# Altium integrated library Jesse_Library.IntLib: 1084 symbols (part 1 of 5) (continued)
## Cap 1206 220nF (224) 10% 50V
designator C?, comment 220nF (224) 10% 50V
贴片电容; ComponentLink1Description: 供应商链接; ComponentLink1URL: http://www.szlcsc.com/product/details_2209.html; Package: 1206; Supplier: LC; SuppliersPartNumber: C1857
footprint 1206_C
pins: 1, 2

## Cap 1206 220pF (221) 10% 50V
designator C?, comment 220pF (221) 10% 50V
贴片电容; ComponentLink1Description: 供应商链接; ComponentLink1URL: http://www.szlcsc.com/product/details_2206.html; Package: 1206; Supplier: LC; SuppliersPartNumber: C1854
footprint 1206_C
pins: 1, 2

## Cap 1206 470nF (474) 10% 50V
designator C?, comment 470nF (474) 10% 50V
贴片电容; ComponentLink1Description: 供应商链接; ComponentLink1URL: http://www.szlcsc.com/product/details_2223.html; Package: 1206; Supplier: LC; SuppliersPartNumber: C1871
footprint 1206_C
pins: 1, 2

## Cap 1206 470pF (471) 10% 50V
designator C?, comment 470pF (471) 10% 50V
贴片电容; ComponentLink1Description: 供应商链接; ComponentLink1URL: http://www.szlcsc.com/product/details_2220.html; Package: 1206; Supplier: LC; SuppliersPartNumber: C1868
footprint 1206_C
pins: 1, 2

## Cap 3216 10uF (106) 10% 16V
designator C?, comment 10uF (106) ±10% 16V
钽电容; ComponentLink1Description: 供应商链接; ComponentLink1URL: http://www.szlcsc.com/product/details_7643.html; Package: 3216; Supplier: LC; SuppliersPartNumber: C7171
footprint CAP TAN A3216
pins: 1, 2

## Cap 3216 47uF (476) 20% 10V
designator C?, comment 47uF (476) ±20% 10V
钽电容; Package: 3216; Supplier: LC; SuppliersPartNumber: C7171; ComponentLink1Description: 立创商城链接; ComponentLink1URL: https://item.szlcsc.com/142466.html
footprint CAP TAN A3216
pins: 1, 2

## Cap 3528 100uF (107) 10% 10V
designator C?, comment 100uF (107) ±10% 10V
钽电容; Package: 3528; Supplier: LC; SuppliersPartNumber: C16133; ComponentLink1Description: 立创商城链接; ComponentLink1URL: https://item.szlcsc.com/123913.html
footprint CAP TAN B3528
pins: 1, 2

## Cap INT 6.3X12.0 220uF 20% 25V
designator C?, comment 220uF 20% 25V
直插电解电容; ComponentLink1Description: 立创商城链接; ComponentLink1URL: https://item.szlcsc.com/125495.html
footprint CAP STR 6.3x12 (6.5mm(Dia.) x 12mm(Length) 2.5mm(Lead Spacing))
pins: 1, 2

## Cap SMD 5.0X5.0 47uF 20% 16V
designator C?, comment 47uF 20%  16V
贴片电解电容; ComponentLink1Description: 立创商城链接; ComponentLink1URL: https://item.szlcsc.com/323605.html
footprint CAP SMT 5X5
pins: 1, 2

## Cap SMD 6.3X5.8 100uF 20% 25V
designator C?, comment 100uF 20% 25V
贴片电解电容; ComponentLink1Description: 立创商城链接; ComponentLink1URL: https://item.szlcsc.com/189933.html
footprint CAP SMT 6.6X5.4 (Capacitor, Aluminium Electrolytric, 6.6mm L X 6.6mm W X 5.4mm H, IPC Medium Density)
pins: 1, 2

## Cap SMD 6.3X7.7 68uF 20% 35V
designator C?, comment 68uF 20%  35V
贴片电解电容; ComponentLink1Description: 立创商城链接; ComponentLink1URL: https://item.szlcsc.com/240983.html
footprint CAP SMT6.3X7.7
pins: 1, 2

## Cap SMD 8X10.2 100uF 20% 35V
designator C?, comment 100uF 20% 35V
贴片电解电容; ComponentLink1Description: 立创商城链接; ComponentLink1URL: https://item.szlcsc.com/265672.html
footprint CAP SMT 8X10.5
pins: 1, 2

## Cap SMD 8X10.2 220uF 20% 25V
designator C?, comment 220uF 20% 25V
贴片电解电容; ComponentLink1Description: 立创商城链接; ComponentLink1URL: https://item.szlcsc.com/189896.html
footprint CAP SMT 8X10.5
pins: 1, 2


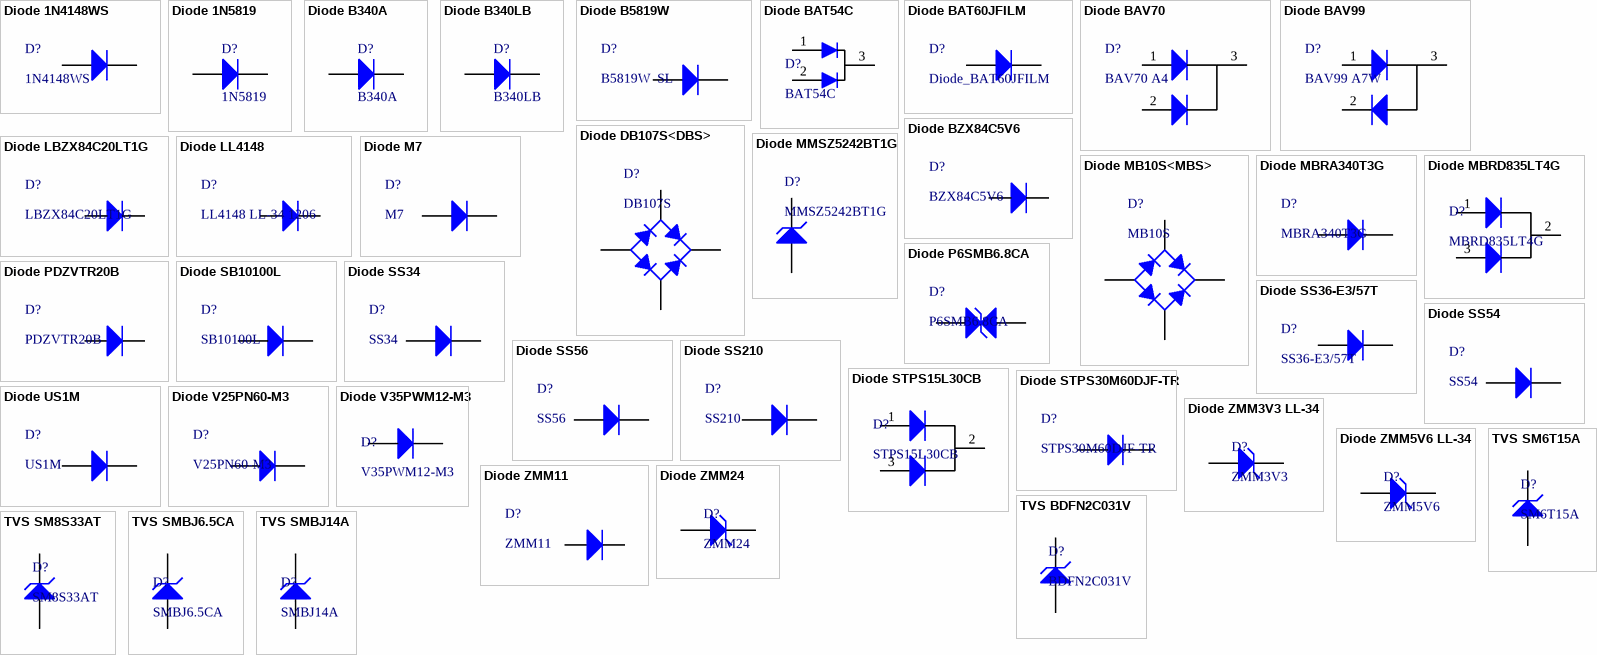
[diagram p11: symbols Diode 1N4148WS to TVS SMBJ14A]

## Diode 1N4148WS
designator D?, comment 1N4148WS
二极管; ComponentLink1Description: 供应商链接; ComponentLink1URL: http://www.szlcsc.com/product/details_2485.html; Package: SOD-323; Supplier: LC; SuppliersPartNumber: C2128
footprint SOD323
pins: 1 A, 2 K

## Diode 1N5819
designator D?, comment 1N5819
肖特基二极管; Published: 8-Jun-2000; LatestRevisionDate: 17-Jul-2002; LatestRevisionNote: Re-released for DXP Platform.; PackageVersion: Sep-1996; PackageReference: SMC; Publisher: Altium Limited; PackageDescription: DO-214-AB/SMC; 2 C-Bend Leads; Body 7.9 x 5.9 mm, inc. leads (LxW); Code_JEDEC: DO-214-AB
footprint SOD123F
pins: 1 A, 2 K

## Diode B340A
designator D?, comment B340A
肖特基二极管; Published: 8-Jun-2000; LatestRevisionDate: 17-Jul-2002; LatestRevisionNote: Re-released for DXP Platform.; PackageVersion: Sep-1996; PackageReference: SMC; Publisher: Altium Limited; PackageDescription: DO-214-AB/SMC; 2 C-Bend Leads; Body 7.9 x 5.9 mm, inc. leads (LxW); Code_JEDEC: DO-214-AB
footprint DO-214AC
pins: 1 A, 2 K

## Diode B340LB
designator D?, comment B340LB
肖特基二极管; Published: 8-Jun-2000; LatestRevisionDate: 17-Jul-2002; LatestRevisionNote: Re-released for DXP Platform.; PackageVersion: Sep-1996; PackageReference: SMC; Publisher: Altium Limited; PackageDescription: DO-214-AB/SMC; 2 C-Bend Leads; Body 7.9 x 5.9 mm, inc. leads (LxW); Code_JEDEC: DO-214-AB
footprint DO-214AA
pins: 1 A, 2 K

## Diode B5819W
designator D?, comment B5819W  SL
肖特基二极管; ComponentLink1Description: 供应商链接; ComponentLink1URL: http://www.szlcsc.com/product/details_9093.html; Package: SOD-123; Supplier: LC; SuppliersPartNumber: C8598
footprint SOD123
pins: 1 A, 2 K

## Diode BAT54C
designator D?, comment BAT54C
肖特基二极管
footprint SOT23-3
pins: 1 A, 2 A, 3 K

## Diode BAT60JFILM
designator D?, comment Diode_BAT60JFILM
二极管; ComponentLink1Description: 供应商链接; ComponentLink1URL: http://www.szlcsc.com/product/details_2485.html; Package: SOD-323; Supplier: LC; SuppliersPartNumber: C2128
footprint SOD323
pins: 1 A, 2 K

## Diode BAV70
designator D?, comment BAV70 A4
开关二极管; ComponentLink1Description: 供应商链接; ComponentLink1URL: http://www.szlcsc.com/product/details_70091.html; Package: SOT-23; Supplier: LC; SuppliersPartNumber: C68978
footprint SOT23-3
pins: 1 A, 2 A, 3 K

## Diode BAV99
designator D?, comment BAV99 A7W
开关二极管; ComponentLink1Description: 供应商链接; ComponentLink1URL: http://www.szlcsc.com/product/details_2877.html; Package: SOT-23; Supplier: LC; SuppliersPartNumber: C2500
footprint SOT23-3
pins: 1 A, 2 A, 3 K

## Diode BZX84C5V6
designator D?, comment BZX84C5V6
开关二极管; ComponentLink1Description: 供应商链接; ComponentLink1URL: http://www.szlcsc.com/product/details_10338.html; Package: LL-34; Supplier: LC; SuppliersPartNumber: C9808
footprint SOT23-3
pins: 1 A, 2 A, 3 K

## Diode DB107S<DBS>
designator D?, comment DB107S
整流桥; ComponentLink1Description: 供应商链接; ComponentLink1URL: http://www.szlcsc.com/product/details_5809.html; Package: DBS; Supplier: LC; SuppliersPartNumber: C5377
footprint DBS
pins: 1 C, 2 K, 3 C, 4 A

## Diode LBZX84C20LT1G
designator D?, comment LBZX84C20LT1G
开关二极管; ComponentLink1Description: 供应商链接; ComponentLink1URL: http://www.szlcsc.com/product/details_10338.html; Package: LL-34; Supplier: LC; SuppliersPartNumber: C9808
footprint SOT23-3
pins: 1 A, 2 A, 3 K

## Diode LL4148
designator D?, comment LL4148 LL-34 1206
开关二极管; ComponentLink1Description: 供应商链接; ComponentLink1URL: http://www.szlcsc.com/product/details_10338.html; Package: LL-34; Supplier: LC; SuppliersPartNumber: C9808
footprint LL-34
pins: 1 A, 2 K

## Diode M7
designator D?, comment M7
二极管; 备注: 1N4007 4007 编号C2464 已经停售, 使用新物料编号C95872; ComponentLink1Description: 供应商链接; ComponentLink1URL: http://www.szlcsc.com/product/details_2841.html; Package: SMA(DO-214AC); Supplier: LC; SuppliersPartNumber: C95872
footprint DO-214AC
pins: 1 A, 2 K

## Diode MB10S<MBS>
designator D?, comment MB10S
整流桥; ComponentLink1Description: 供应商链接; ComponentLink1URL: http://www.szlcsc.com/product/details_2865.html; Package: MBS; Supplier: LC; SuppliersPartNumber: C2488
footprint MBS
pins: 1 C, 2 K, 3 C, 4 A

## Diode MBRA340T3G
designator D?, comment MBRA340T3G
二极管; ComponentLink1Description: 供应商链接; ComponentLink1URL: http://www.szlcsc.com/product/details_23178.html; Package: SMA(DO-214AC); Supplier: LC; SuppliersPartNumber: C22452
footprint DO-214AC
pins: 1 A, 2 K

## Diode MBRD835LT4G
designator D?, comment MBRD835LT4G
肖特基二极管
footprint TO252 (252晶体管)
pins: 1, 2, 3

## Diode MMSZ5242BT1G
designator D?, comment MMSZ5242BT1G
稳压二极管; ComponentLink1Description: 供应商链接; ComponentLink1URL: http://www.szlcsc.com/product/details_10338.html; Package: LL-34; Supplier: LC; SuppliersPartNumber: C9808
footprint SOD123
pins: 1 A, 2 K

## Diode P6SMB6.8CA
designator D?, comment P6SMB6.8CA
TVS管; ComponentLink1Description: 供应商链接; ComponentLink1URL: http://www.szlcsc.com/product/details_79530.html; Package: SMB/DO-214AA; Supplier: LC; SuppliersPartNumber: C78395
footprint DO-214AA
pins: 1 A, 2 K

## Diode PDZVTR20B
designator D?, comment PDZVTR20B
稳压二极管; ComponentLink1Description: 供应商链接; ComponentLink1URL: http://www.szlcsc.com/product/details_10338.html; Package: LL-34; Supplier: LC; SuppliersPartNumber: C9808
footprint SOD128
pins: 1 A, 2 K

## Diode SB10100L
designator D?, comment SB10100L
二极管; ComponentLink1Description: 供应商链接; ComponentLink1URL: http://www.szlcsc.com/product/details_23178.html; Package: SMA(DO-214AC); Supplier: LC; SuppliersPartNumber: C22452
footprint TO277
pins: 1 A, 2 A, K

## Diode SS34
designator D?, comment SS34
二极管; ComponentLink1Description: 供应商链接; ComponentLink1URL: http://www.szlcsc.com/product/details_23178.html; Package: SMA(DO-214AC); Supplier: LC; SuppliersPartNumber: C22452
footprint DO-214AC
pins: 1 A, 2 K

## Diode SS36-E3/57T
designator D?, comment SS36-E3/57T
二极管; ComponentLink1Description: 供应商链接; ComponentLink1URL: http://www.szlcsc.com/product/details_36698.html; Package: SMC(DO-214AB); Supplier: LC; SuppliersPartNumber: C35722
footprint DO-214AB
pins: 1 A, 2 K

## Diode SS54
designator D?, comment SS54
二极管; ComponentLink1Description: 供应商链接; ComponentLink1URL: http://www.szlcsc.com/product/details_23178.html; Package: SMA(DO-214AC); Supplier: LC; SuppliersPartNumber: C22452
footprint DO-214AC
pins: 1 A, 2 K

## Diode SS56
designator D?, comment SS56
二极管; ComponentLink1Description: 供应商链接; ComponentLink1URL: http://www.szlcsc.com/product/details_23178.html; Package: SMA(DO-214AC); Supplier: LC; SuppliersPartNumber: C22452
footprint DO-214AC
pins: 1 A, 2 K

## Diode SS210
designator D?, comment SS210
二极管; ComponentLink1Description: 供应商链接; ComponentLink1URL: http://www.szlcsc.com/product/details_15669.html; Package: SMA(DO-214AC); Supplier: LC; SuppliersPartNumber: C14996
footprint DO-214AC
pins: 1 A, 2 K

## Diode STPS15L30CB
designator D?, comment STPS15L30CB
肖特基二极管
footprint TO252 (252晶体管)
pins: 1, 2, 3

## Diode STPS30M60DJF-TR
designator D?, comment STPS30M60DJF-TR
二极管; ComponentLink1Description: 供应商链接; ComponentLink1URL: http://www.szlcsc.com/product/details_23178.html; Package: SMA(DO-214AC); Supplier: LC; SuppliersPartNumber: C22452
footprint POWERFLAT 5X6
pins: 1 A, 2 A, 3 A, 4 A, 5 K, 6 K, 7 K, 8 K

## Diode US1M
designator D?, comment US1M
二极管; ComponentLink1Description: 供应商链接; ComponentLink1URL: http://www.szlcsc.com/product/details_5885.html; Package: SMA(DO-214AC); Supplier: LC; SuppliersPartNumber: C5441
footprint DO-214AC
pins: 1 A, 2 K

## Diode V25PN60-M3
designator D?, comment V25PN60-M3
肖特基二极管; Package: SMA(DO-214AC); Supplier: LC; SuppliersPartNumber: C22452; ComponentLink1Description: 立创商城链接; ComponentLink1URL: https://item.szlcsc.com/240762.html
footprint TO277
pins: 1 A, 2 A, K

## Diode V35PWM12-M3
designator D?, comment V35PWM12-M3
肖特基二极管; ComponentLink1Description: 立创商城链接; ComponentLink1URL: https://item.szlcsc.com/156647.html
footprint TO252 (252晶体管)
pins: 1, 2, 3

## Diode ZMM3V3 LL-34
designator D?, comment ZMM3V3
稳压二极管; ComponentLink1Description: 供应商链接; ComponentLink1URL: http://www.szlcsc.com/product/details_8535.html; Package: LL-34; Supplier: LC; SuppliersPartNumber: C8056
footprint LL-34
pins: 1 A, 2 K

## Diode ZMM5V6 LL-34
designator D?, comment ZMM5V6
稳压二极管; ComponentLink1Description: 供应商链接; ComponentLink1URL: http://www.szlcsc.com/product/details_8541.html; Package: LL-34; Supplier: LC; SuppliersPartNumber: C8062
footprint LL-34
pins: 1 A, 2 K

## Diode ZMM11
designator D?, comment ZMM11
稳压二极管; ComponentLink1Description: 供应商链接; ComponentLink1URL: http://www.szlcsc.com/product/details_10338.html; Package: LL-34; Supplier: LC; SuppliersPartNumber: C9808
footprint LL-34
pins: 1 A, 2 K

## Diode ZMM24
designator D?, comment ZMM24
稳压二极管; Package: LL-34; Supplier: LC; SuppliersPartNumber: C8062; ComponentLink1Description: 立创商城链接; ComponentLink1URL: https://item.szlcsc.com/8553.html
footprint LL-34
pins: 1 A, 2 K

## TVS BDFN2C031V
designator D?, comment BDFN2C031V
TVS管
footprint DFN2
pins: 1 A, 2 K

## TVS SM6T15A
designator D?, comment SM6T15A
TVS管
footprint DO-214
pins: 1 A, 2 K

## TVS SM8S33AT
designator D?, comment SM8S33AT
TVS管
footprint DO-218 (=DO-218AB)
pins: 1 A, 2 K

## TVS SMBJ6.5CA
designator D?, comment SMBJ6.5CA
TVS管; ComponentLink1Description: 供应商链接; ComponentLink1URL: http://www.szlcsc.com/product/details_23178.html; Package: SMA(DO-214AC); Supplier: LC; SuppliersPartNumber: C22452
footprint DO-214AA
pins: 1 A, 2 K

## TVS SMBJ14A
designator D?, comment SMBJ14A
TVS管; ComponentLink1Description: 供应商链接; ComponentLink1URL: http://www.szlcsc.com/product/details_23178.html; Package: SMA(DO-214AC); Supplier: LC; SuppliersPartNumber: C22452
footprint DO-214AA
pins: 1 A, 2 K

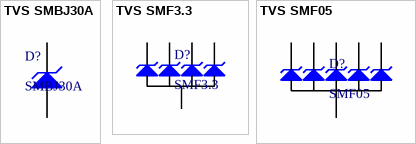
[diagram p12: symbols TVS SMBJ30A to TVS SMF05]

## TVS SMBJ30A
designator D?, comment SMBJ30A
TVS管; ComponentLink1Description: 供应商链接; ComponentLink1URL: http://www.szlcsc.com/product/details_23178.html; Package: SMA(DO-214AC); Supplier: LC; SuppliersPartNumber: C22452
footprint DO-214AA
pins: 1 A, 2 K

## TVS SMF3.3
designator D?, comment SMF3.3
TVS管
footprint SC-70-5
pins: 1, 2, 3, 4, 5

## TVS SMF05
designator D?, comment SMF05
TVS管
footprint SC-70-6(SOT-363)
pins: 1, 2, 3, 4, 5, 6


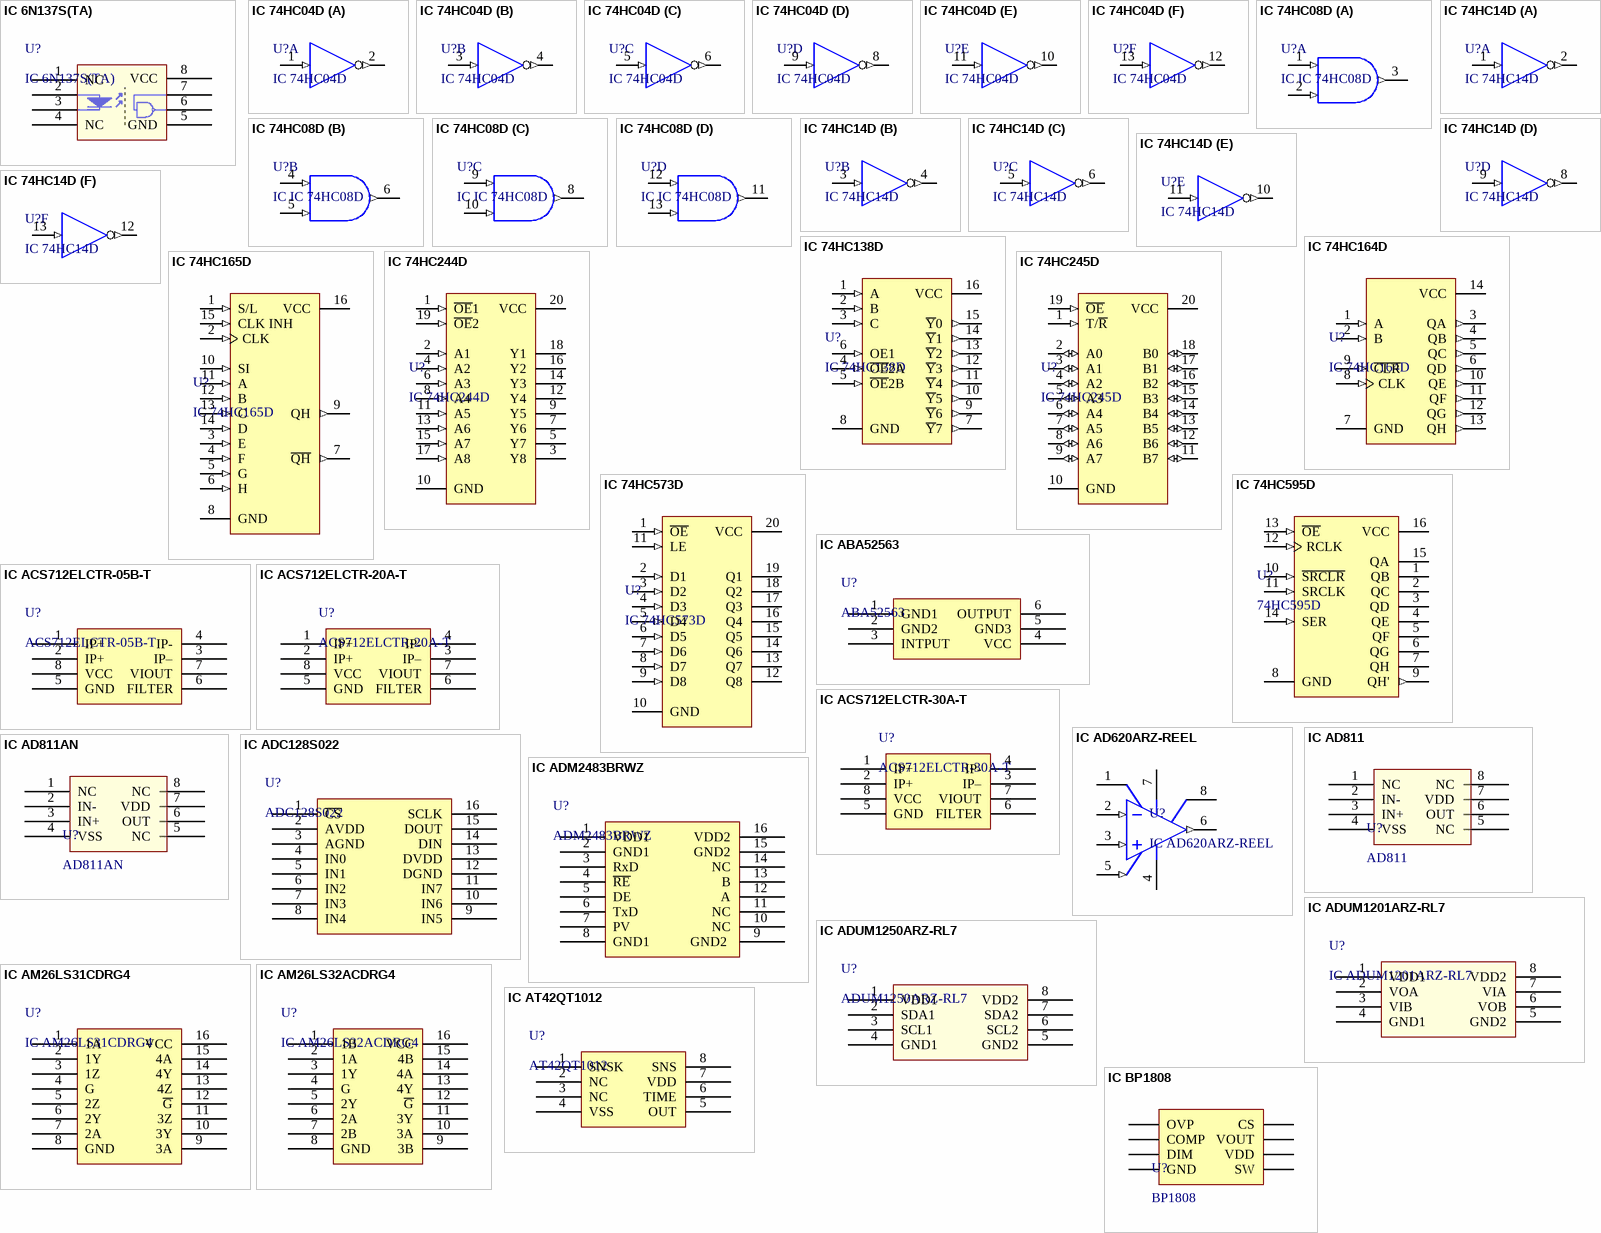
[diagram p13: symbols IC 6N137S(TA) to IC BP1808]

## IC 6N137S(TA)
designator U?
贴片光耦; ComponentLink1Description: 供应商链接; ComponentLink1URL: http://www.szlcsc.com/product/details_17178.html; Package: SMD-8_6.3mm; Supplier: LC; SuppliersPartNumber: C16496
footprint SMD-8_6.3mm
pins: 1 NC, 2 A "Anode", 3 K "Cathode", 4 NC, 5 GND, 6 VO, 7 VE, 8 VCC

## IC 74HC04D
designator U?
74系列逻辑芯片; ComponentLink1Description: 供应商链接; ComponentLink1URL: http://www.szlcsc.com/product/details_6041.html; Package: SOIC-14_150mil; Supplier: LC; SuppliersPartNumber: C5590
footprint SOIC14_150mil
pins on every part: 7 GND (power) hidden, 14 VDD (power) hidden
part A pins: 1 A (in), 2 Y (out)
part B pins: 3 A (in), 4 Y (out)
part C pins: 5 A (in), 6 Y (out)
part D pins: 8 Y (out), 9 A (in)
part E pins: 10 Y (out), 11 A (in)
part F pins: 12 Y (out), 13 A (in)

## IC 74HC08D
designator U?, comment IC IC 74HC08D
74系列逻辑芯片; ComponentLink1Description: 供应商链接; ComponentLink1URL: http://www.szlcsc.com/product/details_6044.html; Package: SOIC-14_150mil; Supplier: LC; SuppliersPartNumber: C5593
footprint SOIC14_150mil
pins on every part: 7 GND (power) hidden, 14 VDD (power) hidden
part A pins: 1 A (in), 2 B (in), 3 Y (out)
part B pins: 4 A (in), 5 B (in), 6 Y (out)
part C pins: 8 Y (out), 9 A (in), 10 B (in)
part D pins: 11 Y (out), 12 A (in), 13 B (in)

## IC 74HC14D
designator U?
74系列逻辑芯片; ComponentLink1Description: 供应商链接; ComponentLink1URL: http://www.szlcsc.com/product/details_6056.html; Package: SOIC-14_150mil; Supplier: LC; SuppliersPartNumber: C5605
footprint SOIC14_150mil
pins on every part: 7 GND (power) hidden, 14 VDD (power) hidden
part A pins: 1 A (in), 2 Y (out)
part B pins: 3 A (in), 4 Y (out)
part C pins: 5 A (in), 6 Y (out)
part D pins: 8 Y (out), 9 A (in)
part E pins: 10 Y (out), 11 A (in)
part F pins: 12 Y (out), 13 A (in)

## IC 74HC138D
designator U?
74系列逻辑芯片; ComponentLink1Description: 供应商链接; ComponentLink1URL: http://www.szlcsc.com/product/details_6053.html; Package: SOIC-16_150mil; Supplier: LC; SuppliersPartNumber: C5602
footprint SOIC16_150mil
pins: 1 A (in), 2 B (in), 3 C (in), 4 ~{OE}2A (in), 5 ~{OE}2B (in), 6 OE1 (in), 7 ~{Y}7 (out), 8 GND (power), 9 ~{Y}6 (out), 10 ~{Y}5 (out), 11 ~{Y}4 (out), 12 ~{Y}3 (out), 13 ~{Y}2 (out), 14 ~{Y}1 (out), 15 ~{Y}0 (out), 16 VCC (power)

## IC 74HC164D
designator U?
74系列逻辑芯片; ComponentLink1Description: 供应商链接; ComponentLink1URL: http://www.szlcsc.com/product/details_7297.html; Package: SOIC-14_150mil; Supplier: LC; SuppliersPartNumber: C6825
footprint SOIC14_150mil
pins: 1 A (in), 2 B (in), 3 QA (out), 4 QB (out), 5 QC (out), 6 QD (out), 7 GND (power), 8 CLK (in), 9 ~{CLR} (in), 10 QE (out), 11 QF (out), 12 QG (out), 13 QH (out), 14 VCC (power)

## IC 74HC165D
designator U?
74系列逻辑芯片; ComponentLink1Description: 供应商链接; ComponentLink1URL: http://www.szlcsc.com/product/details_6064.html; Package: SOIC-16_150mil; Supplier: LC; SuppliersPartNumber: C5613
footprint SOIC16_150mil
pins: 1 S/L (in), 2 CLK (in), 3 E (in), 4 F (in), 5 G (in), 6 H (in), 7 ~{QH} (out), 8 GND (power), 9 QH (out), 10 SI (in), 11 A (in), 12 B (in), 13 C (in), 14 D (in), 15 CLK INH (in), 16 VCC (power)

## IC 74HC244D
designator U?
74系列逻辑芯片; ComponentLink1Description: 供应商链接; ComponentLink1URL: http://www.szlcsc.com/product/details_6073.html; Package: SOIC-20_300mil; Supplier: LC; SuppliersPartNumber: C5622
footprint SOIC20_300mil
pins: 1 ~{OE}1 (in), 2 A1 (in), 3 Y8 (hiz), 4 A2 (in), 5 Y7 (hiz), 6 A3 (in), 7 Y6 (hiz), 8 A4 (in), 9 Y5 (hiz), 10 GND (power), 11 A5 (in), 12 Y4 (hiz), 13 A6 (in), 14 Y3 (hiz), 15 A7 (in), 16 Y2 (hiz), 17 A8 (in), 18 Y1 (hiz), 19 ~{OE}2 (in), 20 VCC (power)

## IC 74HC245D
designator U?
74系列逻辑芯片; ComponentLink1Description: 供应商链接; ComponentLink1URL: http://www.szlcsc.com/product/details_6076.html; Package: SOIC-20_300mil; Supplier: LC; SuppliersPartNumber: C5625
footprint SOIC20_300mil
pins: 1 T/~{R} (in), 2 A0 (io), 3 A1 (io), 4 A2 (io), 5 A3 (io), 6 A4 (io), 7 A5 (io), 8 A6 (io), 9 A7 (io), 10 GND (power), 11 B7 (io), 12 B6 (io), 13 B5 (io), 14 B4 (io), 15 B3 (io), 16 B2 (io), 17 B1 (io), 18 B0 (io), 19 ~{OE} (in), 20 VCC (power)

## IC 74HC573D
designator U?
74系列逻辑芯片; ComponentLink1Description: 供应商链接; ComponentLink1URL: http://www.szlcsc.com/product/details_6059.html; Package: SOIC-20_300mil; Supplier: LC; SuppliersPartNumber: C5608
footprint SOIC20_300mil
pins: 1 ~{OE} (in), 2 D1 (in), 3 D2 (in), 4 D3 (in), 5 D4 (in), 6 D5 (in), 7 D6 (in), 8 D7 (in), 9 D8 (in), 10 GND (power), 11 LE (in), 12 Q8 (hiz), 13 Q7 (hiz), 14 Q6 (hiz), 15 Q5 (hiz), 16 Q4 (hiz), 17 Q3 (hiz), 18 Q2 (hiz), 19 Q1 (hiz), 20 VCC (power)

## IC 74HC595D
designator U?, comment 74HC595D
74系列逻辑芯片; Package: SOIC-16_150mil; Supplier: LC; SuppliersPartNumber: C5947; ComponentLink1Description: 立创商城链接; ComponentLink1URL: http://www.szlcsc.com/product/details_6413.html
footprint SOIC16_150mil
pins: 1 QB (hiz), 2 QC (hiz), 3 QD (hiz), 4 QE (hiz), 5 QF (hiz), 6 QG (hiz), 7 QH (hiz), 8 GND (power), 9 QH' (out), 10 ~{SRCLR} (in), 11 SRCLK (in), 12 RCLK (in), 13 ~{OE} (in), 14 SER (in), 15 QA (hiz), 16 VCC (power)

## IC ABA52563
designator U?, comment ABA52563
3.5 GHz Broadband Silicon RFIC Amplifier; Package: SC-70-6(SOT-363); Supplier: LC; SuppliersPartNumber: C15879
footprint SC-70-6(SOT-363)
pins: 1 GND1, 2 GND2, 3 INTPUT, 4 VCC, 5 GND3, 6 OUTPUT

## IC ACS712ELCTR-05B-T
designator U?, comment ACS712ELCTR-05B-T
电流传感器; Package: SOIC-8_150mil; Supplier: LC; SuppliersPartNumber: C10681; ComponentLink1Description: 立创商城链接; ComponentLink1URL: https://item.szlcsc.com/45473.html
footprint SOIC8_150mil
pins: 1 IP+, 2 IP+, 3 IP–, 4 IP-, 5 GND, 6 FILTER, 7 VIOUT, 8 VCC

## IC ACS712ELCTR-20A-T
designator U?, comment ACS712ELCTR-20A-T
电流传感器; Package: SOIC-8_150mil; Supplier: LC; SuppliersPartNumber: C10681; ComponentLink1Description: 立创商城链接; ComponentLink1URL: https://item.szlcsc.com/11225.html
footprint SOIC8_150mil
pins: 1 IP+, 2 IP+, 3 IP–, 4 IP-, 5 GND, 6 FILTER, 7 VIOUT, 8 VCC

## IC ACS712ELCTR-30A-T
designator U?, comment ACS712ELCTR-30A-T
电流传感器; Package: SOIC-8_150mil; Supplier: LC; SuppliersPartNumber: C10681; ComponentLink1Description: 立创商城链接; ComponentLink1URL: https://item.szlcsc.com/10465.html
footprint SOIC8_150mil
pins: 1 IP+, 2 IP+, 3 IP–, 4 IP-, 5 GND, 6 FILTER, 7 VIOUT, 8 VCC

## IC AD620ARZ-REEL
designator U?
仪放; ComponentLink1Description: 供应商链接; ComponentLink1URL: http://www.szlcsc.com/product/details_10205.html; Package: SOIC-8_150mil; Supplier: LC; SuppliersPartNumber: C9675
footprint SOIC8_150mil
pins: 1 RG, 2 -IN (in), 3 +IN (in), 4 V- (power), 5 REF (in), 6 OUT (out), 7 V+ (power), 8 RG

## IC AD811
designator U?, comment AD811
运算放大器芯片; ComponentLink1Description: 供应商链接; ComponentLink1URL: http://www.szlcsc.com/product/details_10199.html; Package: SOIC-8_150mil; Supplier: LC; SuppliersPartNumber: C9669
footprint SOIC8_150mil
pins: 1 NC, 2 IN-, 3 IN+, 4 VSS, 5 NC, 6 OUT, 7 VDD, 8 NC

## IC AD811AN
designator U?, comment AD811AN
运算放大器芯片; ComponentLink1Description: 供应商链接; ComponentLink1URL: http://www.szlcsc.com/product/details_10199.html; Package: SOIC-8_150mil; Supplier: LC; SuppliersPartNumber: C9669
footprint DIP8
pins: 1 NC, 2 IN-, 3 IN+, 4 VSS, 5 NC, 6 OUT, 7 VDD, 8 NC

## IC ADC128S022
designator U?, comment ADC128S022
ADC芯片; Package: SOIC-16_300mil; Supplier: LC; SuppliersPartNumber: C9637; ComponentLink1Description: 立创商城链接; ComponentLink1URL: https://item.szlcsc.com/191820.html
footprint TSSOP16
pins: 1 ~{CS}, 2 AVDD, 3 AGND, 4 IN0, 5 IN1, 6 IN2, 7 IN3, 8 IN4, 9 IN5, 10 IN6, 11 IN7, 12 DGND, 13 DVDD, 14 DIN, 15 DOUT, 16 SCLK

## IC ADM2483BRWZ
designator U?, comment ADM2483BRWZ
485接口芯片; ComponentLink1Description: 供应商链接; ComponentLink1URL: http://www.szlcsc.com/product/details_10167.html; Package: SOIC-16_300mil; Supplier: LC; SuppliersPartNumber: C9637
footprint SOIC16_300mil
pins: 1 VDD1, 2 GND1, 3 RxD, 4 ~{RE}, 5 DE, 6 TxD, 7 PV, 8 GND1 , 9 GND2 , 10 NC, 11 NC, 12 A, 13 B, 14 NC, 15 GND2, 16 VDD2

## IC ADUM1201ARZ-RL7
designator U?
隔离器; ComponentLink1Description: 供应商链接; ComponentLink1URL: http://www.szlcsc.com/product/details_10199.html; Package: SOIC-8_150mil; Supplier: LC; SuppliersPartNumber: C9669
footprint SOIC8_150mil
pins: 1 VDD1 , 2 VOA, 3 VIB, 4 GND1, 5 GND2, 6 VOB, 7 VIA, 8 VDD2

## IC ADUM1250ARZ-RL7
designator U?, comment ADUM1250ARZ-RL7
隔离器; Package: SOIC-8_150mil; Supplier: LC; SuppliersPartNumber: C9669; ComponentLink1Description: 立创商城链接; ComponentLink1URL: https://item.szlcsc.com/14494.html
footprint SOIC8_150mil
pins: 1 VDD1 , 2 SDA1, 3 SCL1, 4 GND1, 5 GND2, 6 SCL2, 7 SDA2, 8 VDD2

## IC AM26LS31CDRG4
designator U?
接口芯片; ComponentLink1Description: 供应商链接; ComponentLink1URL: http://www.szlcsc.com/product/details_6645.html; Package: SOIC-16_150mil; Supplier: LC; SuppliersPartNumber: C6179
footprint SOIC16_150mil
pins: 1 1A, 2 1Y, 3 1Z, 4 G, 5 2Z, 6 2Y, 7 2A, 8 GND, 9 3A, 10 3Y, 11 3Z, 12 ~{G}, 13 4Z, 14 4Y, 15 4A, 16 VCC

## IC AM26LS32ACDRG4
designator U?
接口芯片; ComponentLink1Description: 供应商链接; ComponentLink1URL: http://www.szlcsc.com/product/details_6646.html; Package: SOIC-16_150mil; Supplier: LC; SuppliersPartNumber: C6180
footprint SOIC16_150mil
pins: 1 1B, 2 1A, 3 1Y, 4 G, 5 2Y, 6 2A, 7 2B, 8 GND, 9 3B, 10 3A, 11 3Y, 12 ~{G}, 13 4Y, 14 4A, 15 4B, 16 VCC

## IC AT42QT1012
designator U?, comment AT42QT1012
触摸感应芯片; Package: SOP-8_EP_150mil; Supplier: LC; SuppliersPartNumber: C16581; ComponentLink1Description: 立创商城链接; ComponentLink1URL: https://item.szlcsc.com/159231.html
footprint SON8 2x2
pins: 1 SNSK, 2 NC, 3 NC, 4 VSS, 5 OUT, 6 TIME, 7 VDD, 8 SNS

## IC BP1808
designator U?, comment BP1808
LED驱动
footprint SOP8_150mil_EP
pins: 1 OVP, 2 COMP, 3 DIM, 4 GND, 5 SW, 6 VDD, 7 VOUT, 8 CS

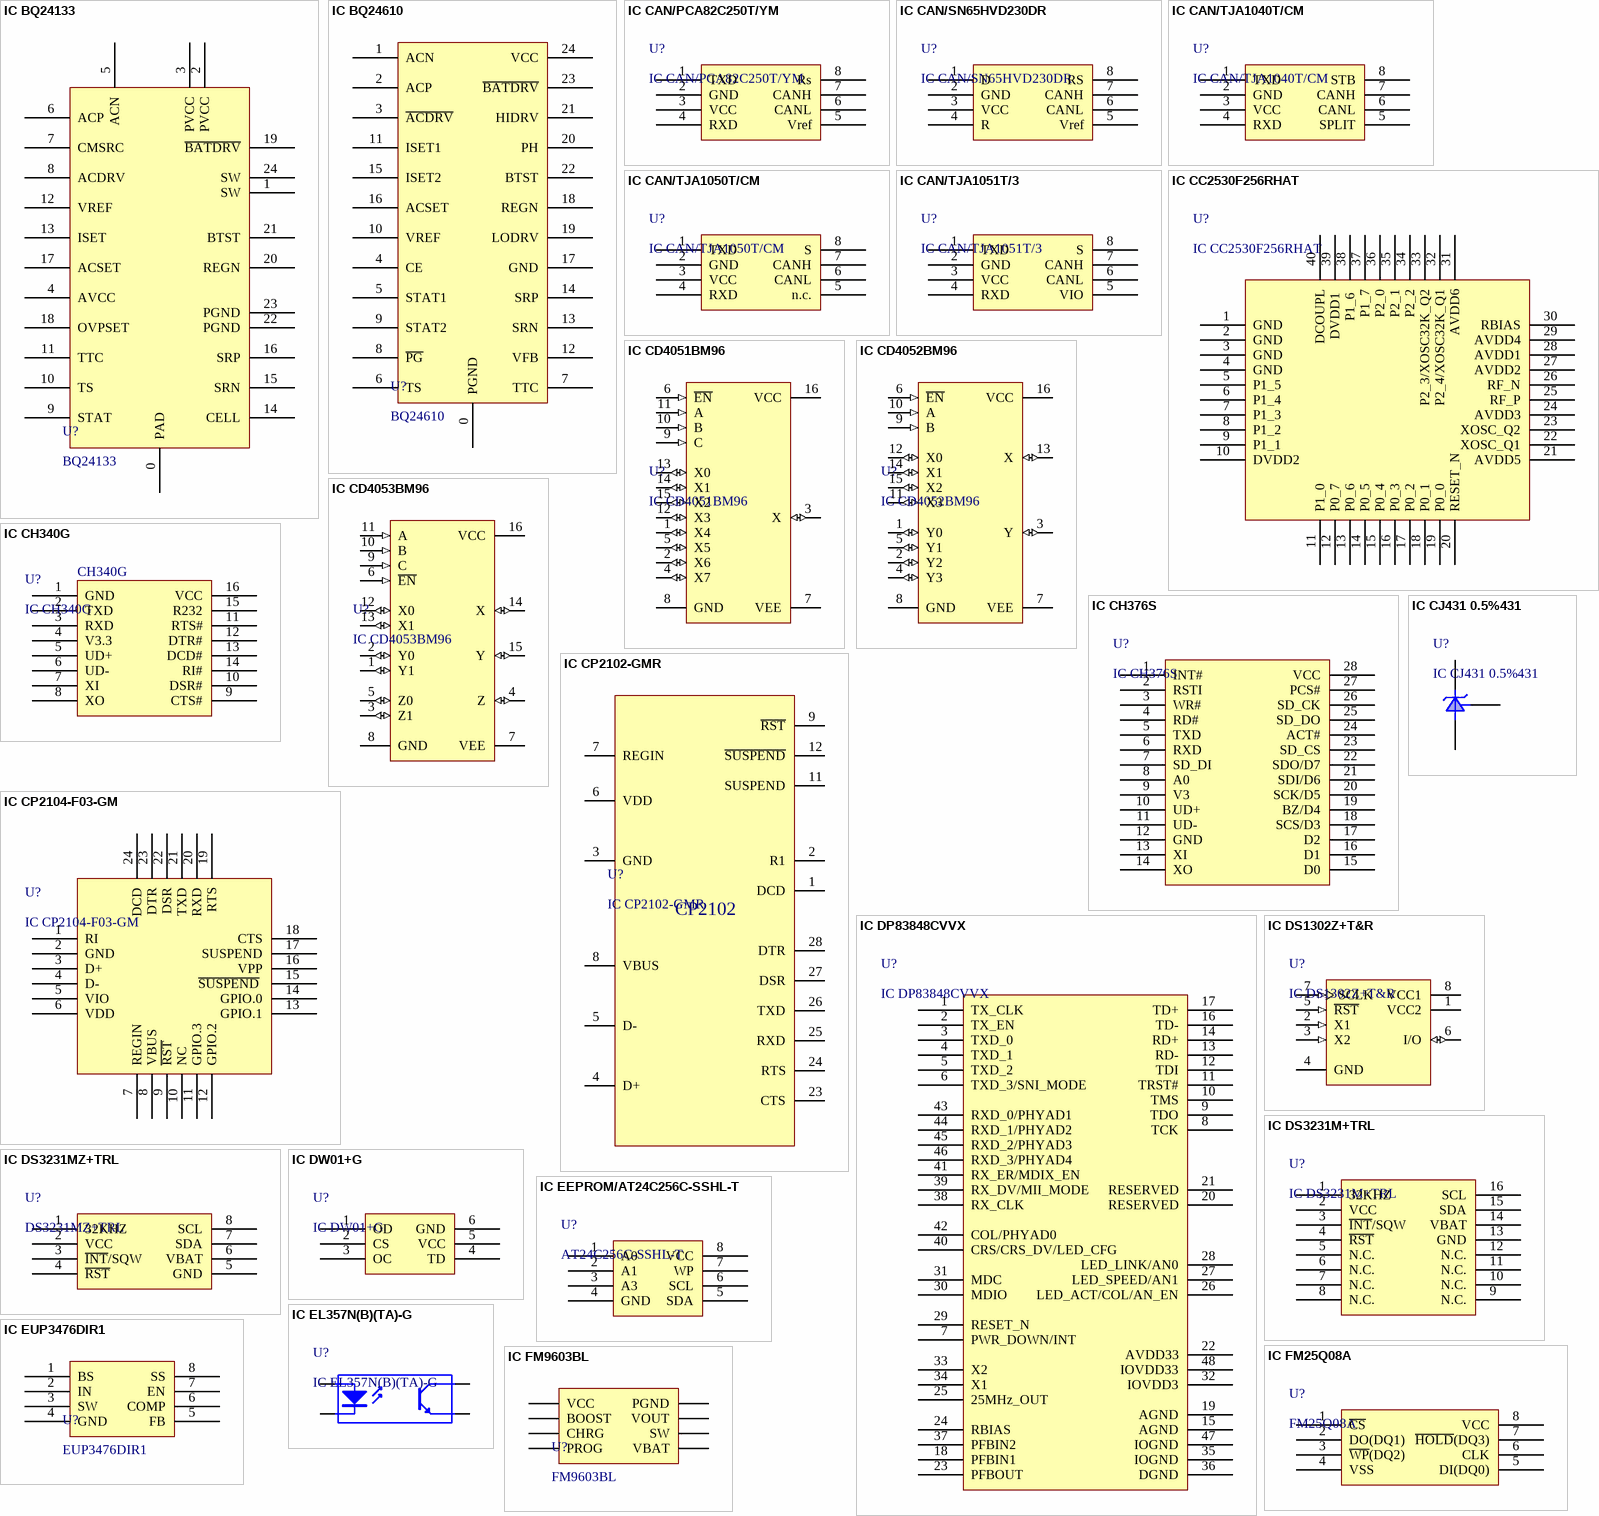
[diagram p14: symbols IC BQ24133 to IC FM9603BL]

## IC BQ24133
designator U?, comment BQ24133
电池电源管理
footprint VQFN24 3.5X5.5
pins: 0 PAD, 1 SW, 2 PVCC, 3 PVCC, 4 AVCC, 5 ACN, 6 ACP, 7 CMSRC, 8 ACDRV, 9 STAT, 10 TS, 11 TTC, 12 VREF, 13 ISET, 14 CELL, 15 SRN, 16 SRP, 17 ACSET, 18 OVPSET, 19 ~{BATDRV}, 20 REGN, 21 BTST, 22 PGND, 23 PGND, 24 SW

## IC BQ24610
designator U?, comment BQ24610
电池电源管理
footprint VQFN24 4X4_EP
pins: 0 PGND, 1 ACN, 2 ACP, 3 ~{ACDRV}, 4 CE, 5 STAT1, 6 TS, 7 TTC, 8 ~{PG}, 9 STAT2, 10 VREF, 11 ISET1, 12 VFB, 13 SRN, 14 SRP, 15 ISET2, 16 ACSET, 17 GND, 18 REGN, 19 LODRV, 20 PH, 21 HIDRV, 22 BTST, 23 ~{BATDRV}, 24 VCC

## IC CAN/PCA82C250T/YM
designator U?
CAN; ComponentLink1Description: 供应商链接; ComponentLink1URL: http://www.szlcsc.com/product/details_7916.html; Package: SOIC-8_150mil; Supplier: LC; SuppliersPartNumber: C7439
footprint SOIC8_150mil
pins: 1 TXD, 2 GND, 3 VCC, 4 RXD, 5 Vref, 6 CANL, 7 CANH, 8 Rs

## IC CAN/SN65HVD230DR
designator U?
CAN; ComponentLink1Description: 供应商链接; ComponentLink1URL: http://www.szlcsc.com/product/details_12661.html; Package: SOIC-8_150mil; Supplier: LC; SuppliersPartNumber: C12084
footprint SOIC8_150mil
pins: 1 D, 2 GND, 3 VCC, 4 R, 5 Vref, 6 CANL, 7 CANH, 8 RS

## IC CAN/TJA1040T/CM
designator U?
CAN; ComponentLink1Description: 供应商链接; ComponentLink1URL: http://www.szlcsc.com/product/details_7423.html; Package: SOIC-8_150mil; Supplier: LC; SuppliersPartNumber: C6951
footprint SOIC8_150mil
pins: 1 TXD, 2 GND, 3 VCC, 4 RXD, 5 SPLIT, 6 CANL, 7 CANH, 8 STB

## IC CAN/TJA1050T/CM
designator U?
CAN; ComponentLink1Description: 供应商链接; ComponentLink1URL: http://www.szlcsc.com/product/details_7424.html; Package: SOIC-8_150mil; Supplier: LC; SuppliersPartNumber: C6952
footprint SOIC8_150mil
pins: 1 TXD, 2 GND, 3 VCC, 4 RXD, 5 n.c., 6 CANL, 7 CANH, 8 S

## IC CAN/TJA1051T/3
designator U?
CAN; ComponentLink1Description: 供应商链接; ComponentLink1URL: http://www.szlcsc.com/product/details_39678.html; Package: SOIC-8_150mil; Supplier: LC; SuppliersPartNumber: C38695
footprint SOIC8_150mil
pins: 1 TXD, 2 GND, 3 VCC, 4 RXD, 5 VIO, 6 CANL, 7 CANH, 8 S